# Altium footprint library 3.22-杂项.PcbLib: 985 footprints (part 27 of 64)
Each footprint in its own frame and in the unit in brackets; x right, y up, seen from the top. Pads: shape width x height; smd on the part's side, far side on the other; paste and mask are expansions set on the pad; w line width, h text height; cw(c..) or ccw(c..) is an arc to the next point about the centre after c.
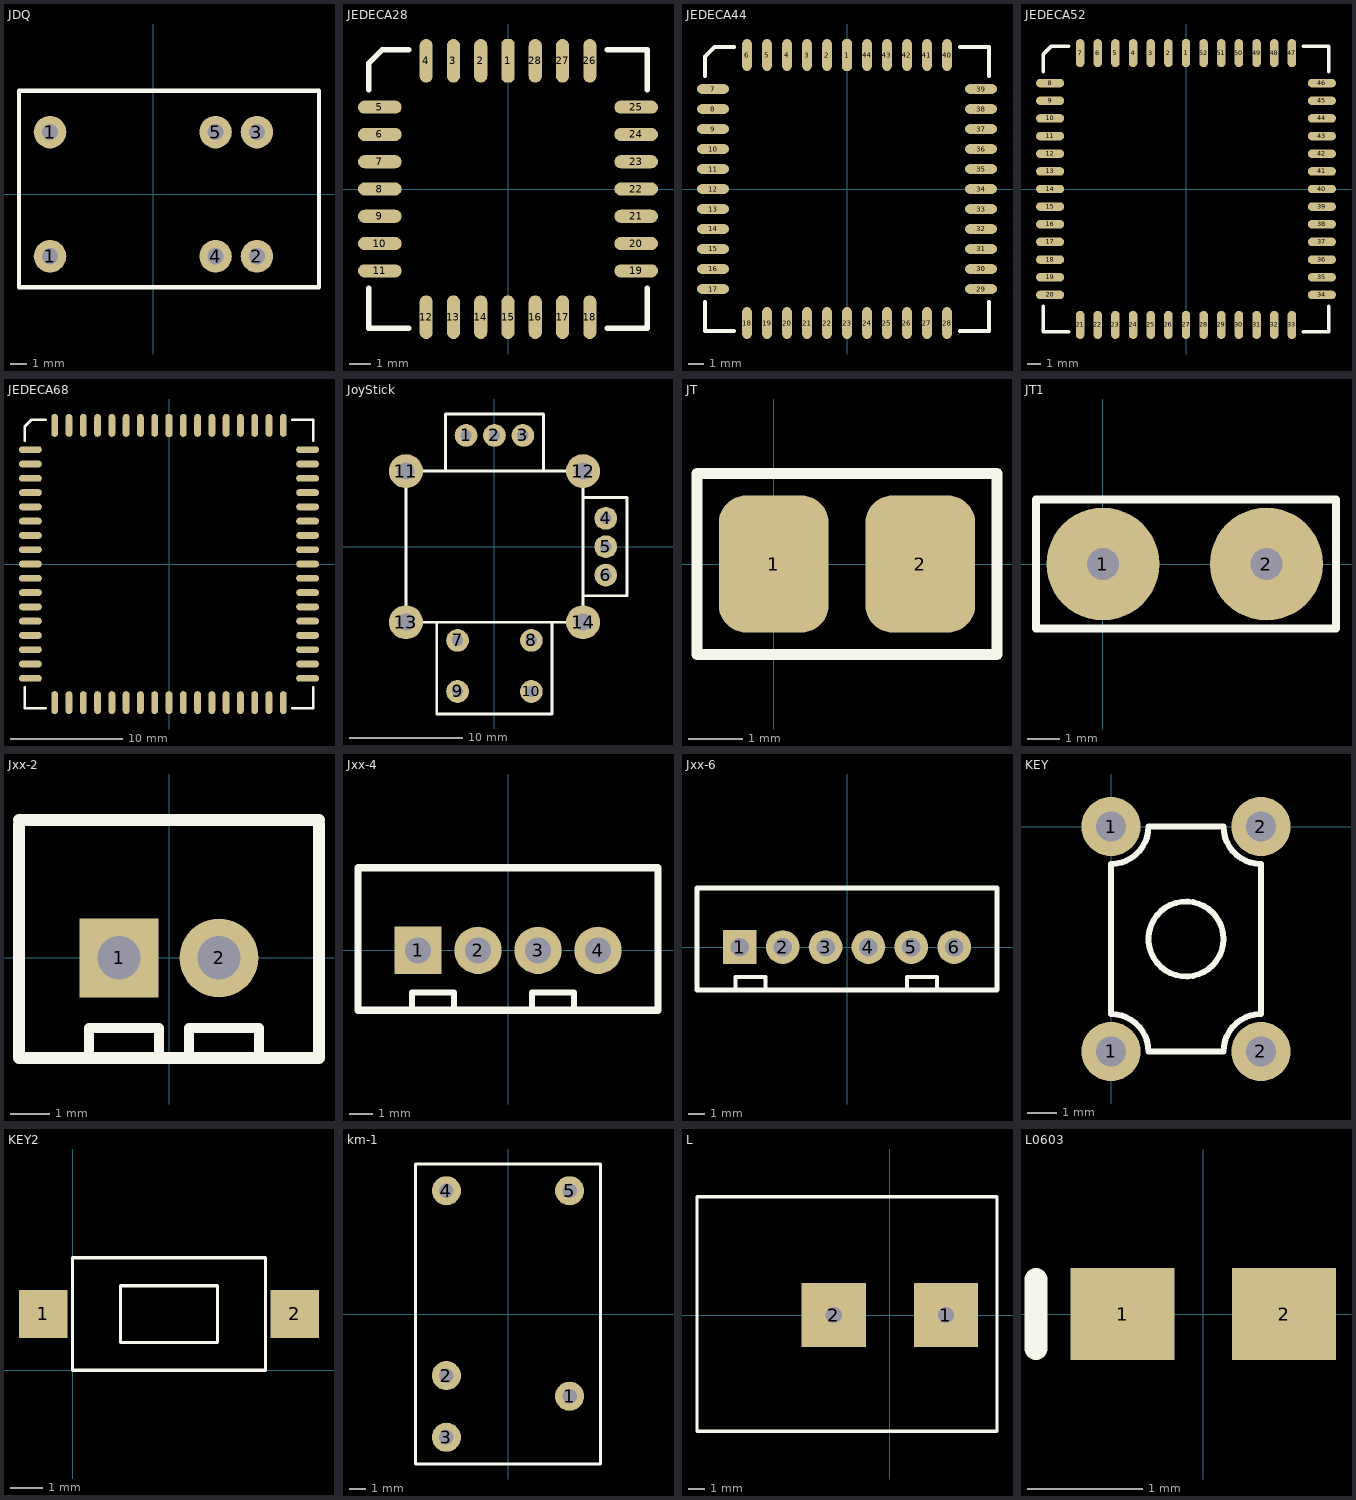
[diagram p26: the footprints below, top view; thin cyan lines are the x and y axes]

## JDQ [mm]
pads (6):
  round 2 hole 1: 1(-6.35,-3.81) 1(-6.35,3.81) 2(6.35,-3.81) 3(6.35,3.81) 4(3.81,-3.81) 5(3.81,3.81)
Top Overlay:
  lines w0.254: -8.255,-5.715 -8.255,6.35 10.16,6.35 10.16,-5.715 -8.255,-5.715

## JEDECA28 [mil]
pads (28):
  oct 24x80 smd: 1(0,235)
  oval 24x80 smd: 2(-50,235) 3(-100,235) 4(-150,235) 12(-150,-235) 13(-100,-235) 14(-50,-235) 15(0,-235) 16(50,-235) 17(100,-235) 18(150,-235) 26(150,235) 27(100,235) 28(50,235)
  oval 80x24 smd: 5(-235,150) 6(-235,100) 7(-235,50) 8(-235,0) 9(-235,-50) 10(-235,-100) 11(-235,-150) 19(235,-150) 20(235,-100) 21(235,-50) 22(235,0) 23(235,50) 24(235,100) 25(235,150)
Top Overlay:
  lines w10: -255,-182 -255,-255 -182,-255 ; -255,182 -255,231 -231,255 -182,255 ; 182,-255 255,-255 255,-182 ; 182,255 255,255 255,182

## JEDECA44 [mil]
pads (44):
  oct 24x80 smd: 1(0,335)
  oval 24x80 smd: 2(-50,335) 3(-100,335) 4(-150,335) 5(-200,335) 6(-250,335) 18(-250,-335) 19(-200,-335) 20(-150,-335) 21(-100,-335) 22(-50,-335) 23(0,-335) 24(50,-335) 25(100,-335) 26(150,-335) 27(200,-335) 28(250,-335) 40(250,335) 41(200,335) 42(150,335) 43(100,335) 44(50,335)
  oval 80x24 smd: 7(-335,250) 8(-335,200) 9(-335,150) 10(-335,100) 11(-335,50) 12(-335,0) 13(-335,-50) 14(-335,-100) 15(-335,-150) 16(-335,-200) 17(-335,-250) 29(335,-250) 30(335,-200) 31(335,-150) 32(335,-100) 33(335,-50) 34(335,0) 35(335,50) 36(335,100) 37(335,150) 38(335,200) 39(335,250)
Top Overlay:
  lines w10: -355,-282 -355,-355 -282,-355 ; -355,282 -355,331 -331,355 -282,355 ; 282,-355 355,-355 355,-282 ; 282,355 355,355 355,282

## JEDECA52 [mil]
pads (52):
  oct 24x80 smd: 1(0,385)
  oval 24x80 smd: 2(-50,385) 3(-100,385) 4(-150,385) 5(-200,385) 6(-250,385) 7(-300,385) 21(-300,-385) 22(-250,-385) 23(-200,-385) 24(-150,-385) 25(-100,-385) 26(-50,-385) 27(0,-385) 28(50,-385) 29(100,-385) 30(150,-385) 31(200,-385) 32(250,-385) 33(300,-385) 47(300,385) 48(250,385) 49(200,385) 50(150,385) 51(100,385) 52(50,385)
  oval 80x24 smd: 8(-385,300) 9(-385,250) 10(-385,200) 11(-385,150) 12(-385,100) 13(-385,50) 14(-385,0) 15(-385,-50) 16(-385,-100) 17(-385,-150) 18(-385,-200) 19(-385,-250) 20(-385,-300) 34(385,-300) 35(385,-250) 36(385,-200) 37(385,-150) 38(385,-100) 39(385,-50) 40(385,0) 41(385,50) 42(385,100) 43(385,150) 44(385,200) 45(385,250) 46(385,300)
Top Overlay:
  lines w10: -405,-332 -405,-405 -332,-405 ; -405,332 -405,381 -381,405 -332,405 ; 332,-405 405,-405 405,-332 ; 332,405 405,405 405,332

## JEDECA68 [mil]
pads (68):
  oct 24x80 smd: 1(0,485)
  oval 24x80 smd: 2(-50,485) 3(-100,485) 4(-150,485) 5(-200,485) 6(-250,485) 7(-300,485) 8(-350,485) 9(-400,485) 27(-400,-485) 28(-350,-485) 29(-300,-485) 30(-250,-485) 31(-200,-485) 32(-150,-485) 33(-100,-485) 34(-50,-485) 35(0,-485) 36(50,-485) 37(100,-485) 38(150,-485) 39(200,-485) 40(250,-485) 41(300,-485) 42(350,-485) 43(400,-485) 61(400,485) 62(350,485) 63(300,485) 64(250,485) 65(200,485) 66(150,485) 67(100,485) 68(50,485)
  oval 80x24 smd: 10(-485,400) 11(-485,350) 12(-485,300) 13(-485,250) 14(-485,200) 15(-485,150) 16(-485,100) 17(-485,50) 18(-485,0) 19(-485,-50) 20(-485,-100) 21(-485,-150) 22(-485,-200) 23(-485,-250) 24(-485,-300) 25(-485,-350) 26(-485,-400) 44(485,-400) 45(485,-350) 46(485,-300) 47(485,-250) 48(485,-200) 49(485,-150) 50(485,-100) 51(485,-50) 52(485,0) 53(485,50) 54(485,100) 55(485,150) 56(485,200) 57(485,250) 58(485,300) 59(485,350) 60(485,400)
Top Overlay:
  lines w10: -505,-432 -505,-505 -432,-505 ; -505,432 -505,481 -481,505 -432,505 ; 432,-505 505,-505 505,-432 ; 432,505 505,505 505,432

## JoyStick [mm] "ģ?"
height 20
pads (14):
  round 2 hole 1: 1(-2.5,9.8) 2(0,9.8) 3(2.5,9.8) 4(9.8,2.5) 5(9.8,0) 6(9.8,-2.5) 7(-3.25,-8.25) 8(3.25,-8.25) 9(-3.25,-12.75) 10(3.25,-12.75)
  round 3 hole 1.5: 11(-7.8,6.65) 12(7.8,6.65) 13(-7.8,-6.65) 14(7.8,-6.65)
Top Overlay:
  lines w0.254: -5.08,-6.65 -5.08,-14.732 5.08,-14.732 5.08,-6.65 ; -4.318,6.65 -4.318,11.684 4.318,11.684 4.318,6.65 ; 7.8,-4.318 11.684,-4.318 11.684,4.318 7.8,4.318 ; -7.8,-6.65 -7.8,6.65 7.8,6.65 7.8,-6.65 -7.8,-6.65

## JT [mm]
pads (2):
  rrect50% 2x2.5 smd: 1(0,0) 2(2.667,0)
Top Overlay:
  lines w0.2: -1.397,-1.651 -1.397,1.651 4.064,1.651 4.064,-1.651 -1.397,-1.651

## JT1 [mm]
pads (2):
  round 3.5 hole 1: 1(0,0) 2(5.08,0)
Top Overlay:
  lines w0.254: -2.079,-2 7.239,-2 7.239,2 2.921,2 -2.079,2 -2.079,0 -2.079,-2

## Jxx-2 [mm] "非2510的2芯可插拨白插座"
height 10
pads (2):
  rect 2x2 hole 1.1: 1(-1.27,0)
  round 2 hole 1.1: 2(1.27,0)
Top Overlay:
  lines w0.254: -2.032,-2.54 -2.032,-1.778 -0.254,-1.778 -0.254,-2.54 ; 0.508,-2.54 0.508,-1.778 2.286,-1.778 2.286,-2.54
  lines w0.305: -3.81,3.4 -3.81,-2.54 3.81,-2.54 3.81,3.4 ; -3.81,3.5 3.81,3.5

## Jxx-4 [mm] "非2510的4芯可插拨白插座"
height 10
pads (4):
  rect 2x2 hole 1.1: 1(-3.81,0)
  round 2 hole 1.1: 2(-1.27,0) 3(1.27,0) 4(3.81,0)
Top Overlay:
  lines w0.254: -4.064,-2.54 -4.064,-1.778 -2.286,-1.778 -2.286,-2.54 ; 1.016,-2.54 1.016,-1.778 2.794,-1.778 2.794,-2.54
  lines w0.305: -6.35,3.4 -6.35,-2.54 6.35,-2.54 6.35,3.4 ; -6.35,3.5 6.35,3.5

## Jxx-6 [mm] "非2510的6芯可插拨白插座"
height 10
pads (6):
  rect 2x2 hole 1.1: 1(-6.35,0)
  round 2 hole 1.1: 2(-3.81,0) 3(-1.27,0) 4(1.27,0) 5(3.81,0) 6(6.35,0)
Top Overlay:
  lines w0.254: -6.604,-2.54 -6.604,-1.778 -4.826,-1.778 -4.826,-2.54 ; 3.556,-2.54 3.556,-1.778 5.334,-1.778 5.334,-2.54
  lines w0.305: -8.89,3.4 -8.89,-2.54 8.89,-2.54 8.89,3.4 ; -8.89,3.5 8.89,3.5

## KEY [mm]
pads (4):
  round 2 hole 1: 1(0,-7.62) 1(0,0) 2(5.08,-7.62) 2(5.08,0)
Top Overlay:
  circle w0.2: c2.54,-3.81 r1.27
  lines w0.152: 1.27,-7.62 3.81,-7.62
  lines w0.2: 5.08,-1.27 cw(c5.08,0) 3.81,0 1.27,0 cw(c0,0) 0,-1.27 0,-6.35 cw(c0,-7.62) 1.27,-7.62 3.81,-7.62 cw(c5.08,-7.62) 5.08,-6.35 5.08,-1.27 ; 5.08,-1.27 5.08,-1.27

## KEY2 [mil]
pads (2):
  rect 59.06x59.06 smd: 1(-36,69) 2(272,69)
Top Overlay:
  lines w3.94: 0,0 236.22,0 236.22,137.8 0,137.8 0,0 ; 58.79,34 177.5,34 177.5,68.83 177.5,103.54 58.79,103.54 58.79,103.5 58.79,34
3D body: height 118.11, standoff 0, extent 59,34.5 177.5,103
3D body: height 78.74, standoff 0, extent 0,0 236,137.5

## km-1 [mm]
pads (5):
  round 1.8 hole 0.9: 1(3.81,-5.08) 2(-3.81,-3.81) 3(-3.81,-7.62) 4(-3.81,7.62) 5(3.81,7.62)
Top Overlay:
  lines w0.203: -5.715,-9.271 5.715,-9.271 5.715,9.271 -5.715,9.271 -5.715,-9.271

## L [mm]
pads (2):
  rect 4x4 hole 1: 1(3.492,0) 2(-3.492,0)
Top Overlay:
  lines w0.203: -12.002,-7.239 -12.002,7.366 6.667,7.366 6.667,-7.239 -12.002,-7.239

## L0603 [mm] "Chip Inductor; Body 1.6 x 0.8 mm (LxW typ)"
height 0.55
pads (2):
  rect 0.9x0.8 smd: 1(-0.7,0) 2(0.7,0)
Top Overlay:
  lines w0.2: -1.45,-0.3 -1.45,0.3